# Altium footprint library Connectors - Rectangular Headers Male Pins.PcbLib: 115 footprints (part 8 of 8)
Each footprint in its own frame and in the unit in brackets; x right, y up, seen from the top. Pads: shape width x height; smd on the part's side, far side on the other; paste and mask are expansions set on the pad; w line width, h text height; cw(c..) or ccw(c..) is an arc to the next point about the centre after c.
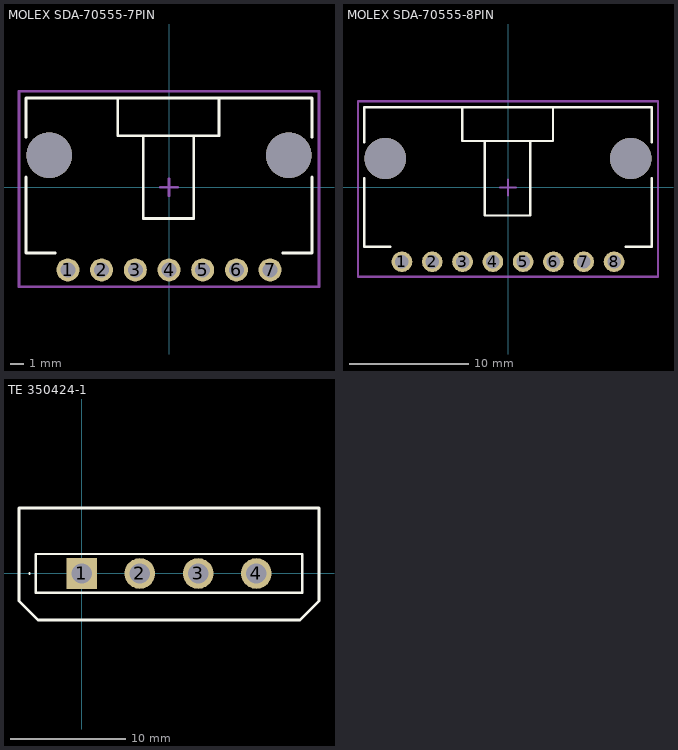
[diagram p7: the footprints below, top view; thin cyan lines are the x and y axes]

## MOLEX SDA-70555-7PIN [mm] "SL Right Angle Header W/LAtch & Trip-Pegs 2.54mm Centres"
height 6.99
pads (7):
  round 1.73 hole 1.13: 1(-7.62,-6.223) 2(-5.08,-6.223) 3(-2.54,-6.223) 4(0,-6.223) 5(2.54,-6.223) 6(5.08,-6.223) 7(7.62,-6.223)
via -9.02,2.417 diameter 3.45 hole 3.45
via 9.02,2.417 diameter 3.45 hole 3.45
Top Overlay:
  lines w0.2: -10.78,0.777 -10.78,-4.953 -8.58,-4.953 ; -10.78,3.777 -10.78,6.731 10.78,6.731 10.78,3.777 ; -3.85,6.731 -3.85,3.892 3.77,3.892 3.77,6.731 ; -1.945,3.892 -1.945,-2.346 1.865,-2.346 1.865,3.892 ; 8.58,-4.953 10.78,-4.953 10.78,0.777
Mechanical 15:
  lines w0.2: -0.635,0 0.635,0 ; 0,-0.635 0,0.635 ; -11.303,-7.493 -11.303,7.239 11.303,7.239 11.303,-7.493 -11.303,-7.493
3D body "705550006.STEP": height 6.98, standoff -3.3, extent -10.795,-6.923 10.795,6.666

## MOLEX SDA-70555-8PIN [mm] "SL Right Angle Header W/LAtch & Trip-Pegs 2.54mm Centres"
height 6.99
pads (8):
  round 1.73 hole 1.13: 1(-8.89,-6.223) 2(-6.35,-6.223) 3(-3.81,-6.223) 4(-1.27,-6.223) 5(1.27,-6.223) 6(3.81,-6.223) 7(6.35,-6.223) 8(8.89,-6.223)
via 10.29,2.417 diameter 3.45 hole 3.45
via -10.29,2.417 diameter 3.45 hole 3.45
Top Overlay:
  lines w0.2: -12.05,0.777 -12.05,-4.953 -9.85,-4.953 ; -12.05,3.777 -12.05,6.731 12.05,6.731 12.05,3.777 ; -3.85,6.731 -3.85,3.892 3.77,3.892 3.77,6.731 ; -1.945,3.892 -1.945,-2.346 1.865,-2.346 1.865,3.892 ; 9.85,-4.953 12.05,-4.953 12.05,0.777
Mechanical 15:
  lines w0.2: -0.635,0 0.635,0 ; 0,-0.635 0,0.635 ; -12.573,-7.493 12.573,-7.493 12.573,7.239 -12.573,7.239 -12.573,-7.493
3D body "705550007.STEP": height 6.98, standoff -3.3, extent -12.065,-6.923 12.065,6.666

## TE 350424-1 [mm] "Periphral Power Connector"
pads (4):
  rect 2.67x2.67 hole 1.78: 1(0,0)
  round 2.67 hole 1.78: 2(5.08,0) 3(10.16,0) 4(15.24,0)
Top Overlay:
  lines w0.1: -4.6,0 cw(c-4.55,0) -4.5,0 cw(c-4.55,0) -4.6,0
  lines w0.2: -4,-1.69 -4,1.69 19.24,1.69 19.24,-1.69 -4,-1.69
  lines w0.254: -5.461,-2.413 -5.461,5.715 20.701,5.715 20.701,-2.413 19.05,-4.064 -3.81,-4.064 -5.461,-2.413
Mechanical 15:
  lines w0.1: -4,-1.69 -4,1.69 19.24,1.69 19.24,-1.69 -4,-1.69
3D body "350424-1.stp": height 10.24, standoff -5, extent -5.08,-4.064 20.32,5.461